# Altium footprint library CMR_Miscellaneous_Devices.PcbLib: 103 footprints (part 4 of 7)
Each footprint in its own frame and in the unit in brackets; x right, y up, seen from the top. Pads: shape width x height; smd on the part's side, far side on the other; paste and mask are expansions set on the pad; w line width, h text height; cw(c..) or ccw(c..) is an arc to the next point about the centre after c.
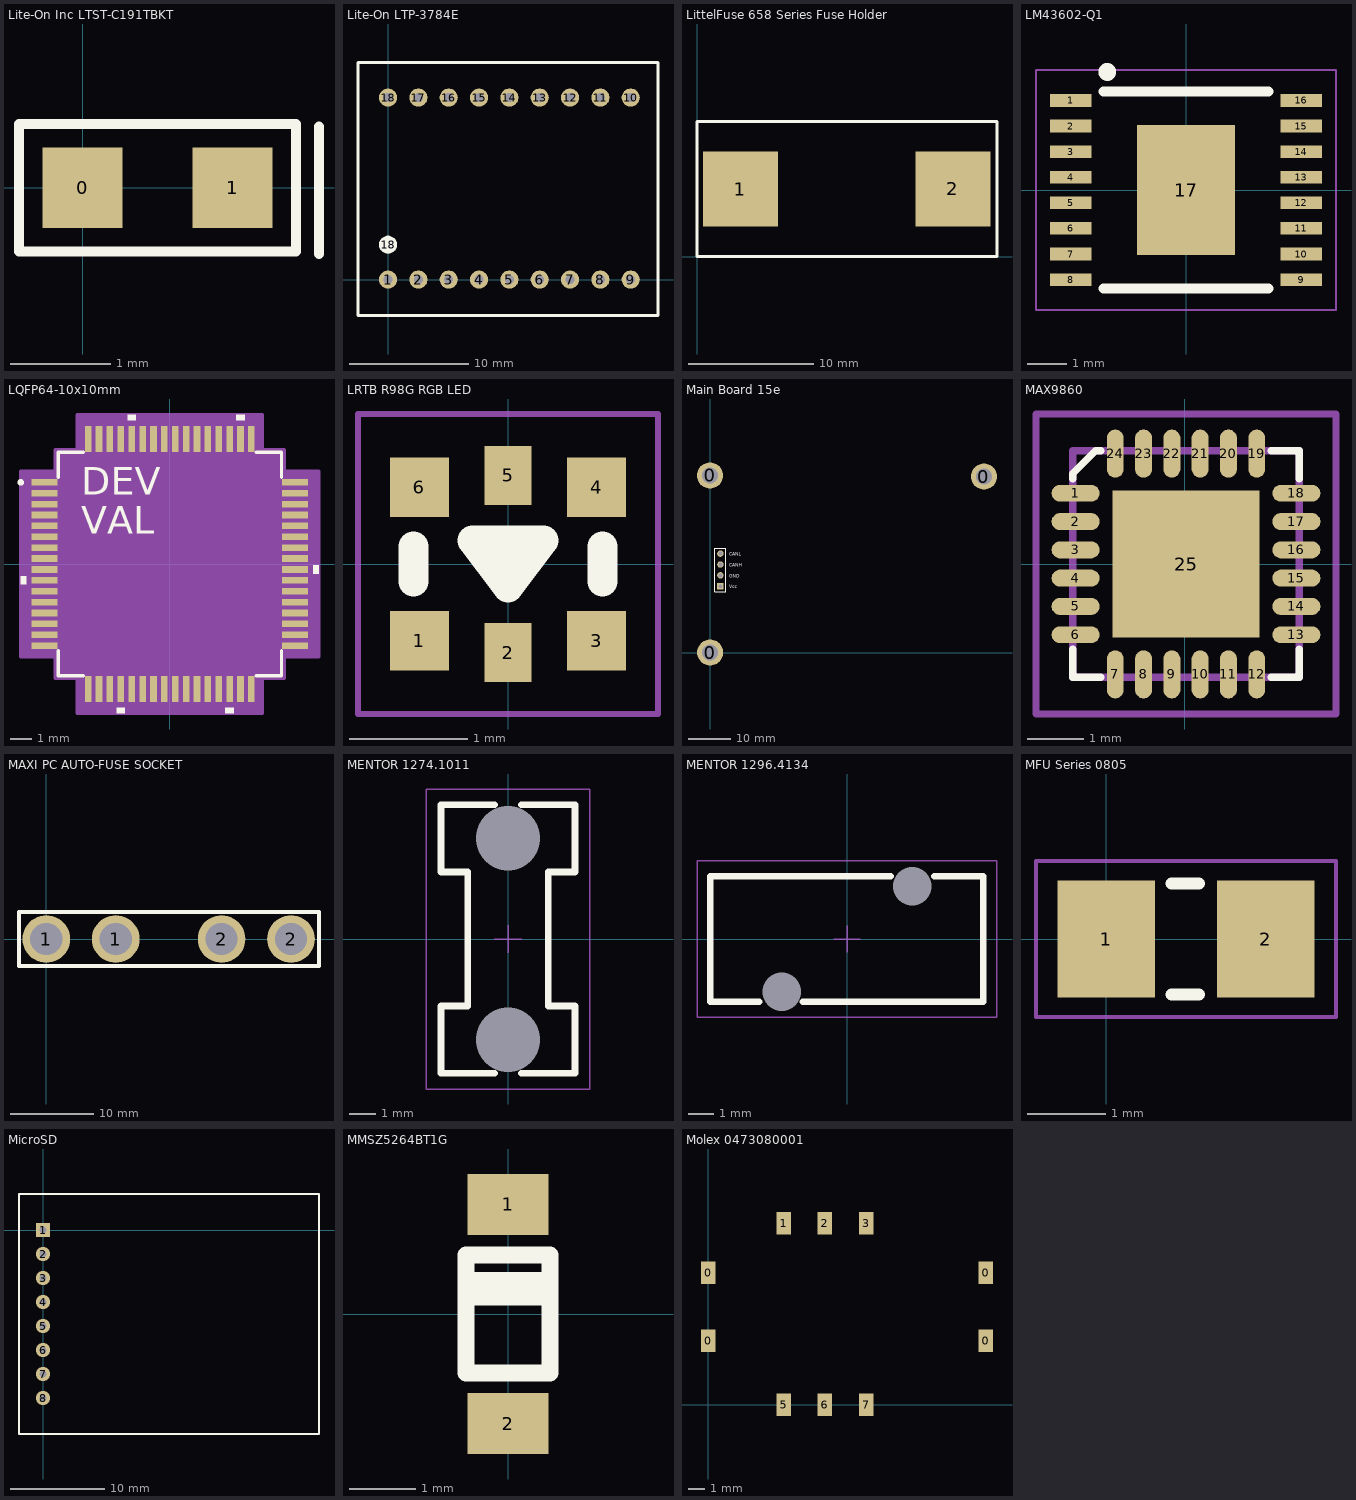
[diagram p3: the footprints below, top view; thin cyan lines are the x and y axes]

## Lite-On Inc LTST-C191TBKT [mm] "LED 468NM BLUE CLEAR 0603 SMD"
height 55
pads (2):
  rect 0.8x0.8 smd: 0(0,0) 1(1.5,0)
Top Overlay:
  lines w0.1: 2.362,-0.66 2.362,0.61 ; -0.635,-0.635 2.134,-0.635 2.134,0.635 -0.635,0.635 -0.635,-0.635
3D body: height 0.55, standoff 0, extent -0.508,-0.508 2.007,0.508

## Lite-On LTP-3784E [mil]
pads (19):
  round 60 hole 30: 1(0,0) 2(100,0) 3(200,0) 4(300,0) 5(400,0) 6(500,0) 7(600,0) 8(700,0) 9(800,0) 10(800,600) 11(700,600) 12(600,600) 13(500,600) 14(400,600) 15(300,600) 16(200,600) 17(100,600) 18(0,600)
  round 60 on Top Overlay: 18(0,115)
Top Overlay:
  lines w10: -98.98,-117.68 -98.98,715 890,715 890,-117.68 -98.98,-117.68
3D body: height 307.09, standoff 39.37, extent -98.96,-117.66 889.98,714.98

## LittelFuse 658 Series Fuse Holder [mm] "Fuse Holder"
height 13.2
pads (2):
  rect 6x6 smd: 1(3.48,5.385) 2(20.472,5.41)
Top Overlay:
  lines w0.254: 0,0 24,0 24,10.8 0,10.8 0,0
3D body: height 13.2, standoff 0, extent 0.584,-0.076 23.292,10.744

## LM43602-Q1 [mm] "SIMPLE SWITCHER 3.5V TO 36V INPUT 2A OUTPUT"
pads (17):
  rect 1.05x0.32 smd: 1(-2.925,2.275) 2(-2.925,1.625) 3(-2.925,0.975) 4(-2.925,0.325) 5(-2.925,-0.325) 6(-2.925,-0.975) 7(-2.925,-1.625) 8(-2.925,-2.275) 9(2.925,-2.275) 10(2.925,-1.625) 11(2.925,-0.975) 12(2.925,-0.325) 13(2.925,0.325) 14(2.925,0.975) 15(2.925,1.625) 16(2.925,2.275)
  rect 2.5x3.3 smd paste-0.5: 17(0,0)
Top Overlay:
  circle w0.254: c-2,3 r0.1
  lines w0.254: -2.1,-2.5 2.1,-2.5 ; -2.1,2.5 2.1,2.5
Mechanical 15:
  lines w0.051: -0.508,0 0.508,0 ; 0,-0.508 0,0.508 ; -3.81,-3.048 -3.81,2.032 -3.81,3.048 0,3.048 3.81,3.048 3.81,2.54 3.81,-3.048 0,-3.048 -3.81,-3.048
3D body "tssop_16.step": height 1.19, standoff -0.03, extent -3.211,-2.504 3.191,2.496

## LQFP64-10x10mm [mm]
pads (64):
  rect 1.194x0.305 smd: 1(-5.75,3.75) 2(-5.75,3.25) 3(-5.75,2.75) 4(-5.75,2.25) 5(-5.75,1.75) 6(-5.75,1.25) 7(-5.75,0.75) 8(-5.75,0.25) 9(-5.75,-0.25) 10(-5.75,-0.75) 11(-5.75,-1.25) 12(-5.75,-1.75) 13(-5.75,-2.25) 14(-5.75,-2.75) 15(-5.75,-3.25) 16(-5.75,-3.75) 33(5.75,-3.75) 34(5.75,-3.25) 35(5.75,-2.75) 36(5.75,-2.25) 37(5.75,-1.75) 38(5.75,-1.25) 39(5.75,-0.75) 40(5.75,-0.25) 41(5.75,0.25) 42(5.75,0.75) 43(5.75,1.25) 44(5.75,1.75) 45(5.75,2.25) 46(5.75,2.75) 47(5.75,3.25) 48(5.75,3.75)
  rect 0.305x1.194 smd: 17(-3.75,-5.75) 18(-3.25,-5.75) 19(-2.75,-5.75) 20(-2.25,-5.75) 21(-1.75,-5.75) 22(-1.25,-5.75) 23(-0.75,-5.75) 24(-0.25,-5.75) 25(0.25,-5.75) 26(0.75,-5.75) 27(1.25,-5.75) 28(1.75,-5.75) 29(2.25,-5.75) 30(2.75,-5.75) 31(3.25,-5.75) 32(3.75,-5.75) 49(3.75,5.75) 50(3.25,5.75) 51(2.75,5.75) 52(2.25,5.75) 53(1.75,5.75) 54(1.25,5.75) 55(0.75,5.75) 56(0.25,5.75) 57(-0.25,5.75) 58(-0.75,5.75) 59(-1.25,5.75) 60(-1.75,5.75) 61(-2.25,5.75) 62(-2.75,5.75) 63(-3.25,5.75) 64(-3.75,5.75)
Top Overlay:
  circle w0.152: c-6.851,3.75 r0.076
  region: -6.601,-0.56 -6.855,-0.56 -6.855,-0.941 -6.601,-0.941
  region: -2.06,-6.601 -2.441,-6.601 -2.441,-6.855 -2.06,-6.855
  region: 2.94,-6.601 2.559,-6.601 2.559,-6.855 2.94,-6.855
  region: 6.601,-0.059 6.855,-0.059 6.855,-0.44 6.601,-0.44
  region: 3.441,6.601 3.06,6.601 3.06,6.855 3.441,6.855
  region: -1.559,6.601 -1.94,6.601 -1.94,6.855 -1.559,6.855
  lines w0.152: -5.131,-3.975 -5.131,-5.131 -3.975,-5.131 ; -5.131,3.975 -5.131,5.131 -3.975,5.131 ; 3.975,-5.131 5.131,-5.131 5.131,-3.975 ; 3.975,5.131 5.131,5.131 5.131,3.975
  text "DEV" at -4.064,3.175 h1.27
  text "VAL" at -4.064,1.397 h1.27
Mechanical 13:
  circle w0: c-4.518,3.75 r0.076
  text "RefDes2" at 0,0 h1.27
Mechanical 15:
  region: -4.258,-5.258 -5.258,-5.258 -5.258,-4.258 -6.855,-4.258 -6.855,4.258 -5.258,4.258 -5.258,5.258 -4.258,5.258 -4.258,6.855 4.258,6.855 4.258,5.258 5.258,5.258 5.258,4.258 6.855,4.258 6.855,-4.258 5.258,-4.258 5.258,-5.258 4.258,-5.258 4.258,-6.855 -4.258,-6.855
  lines w0.152: -6.855,-4.258 -5.258,-4.258 -5.258,-5.258 -4.258,-5.258 -4.258,-6.855 4.258,-6.855 4.258,-5.258 5.258,-5.258 5.258,-4.258 6.855,-4.258 6.855,4.258 5.258,4.258 5.258,5.258 4.258,5.258 4.258,6.855 -4.258,6.855 -4.258,5.258 -5.258,5.258 -5.258,4.258 -6.855,4.258 -6.855,-4.258
Multi-Layer:
  text "Copyright (C) 2016 Accelerated Designs. All rights reserved" at -0.127,-1.778 h0.03
3D body "LQFP64-10x10mm.stp": height 1.6, standoff 0, extent -5.997,-5.997 5.997,5.997

## LRTB R98G RGB LED [mm] "OSRAM SMT RGB LED LRTB R98G"
pads (6):
  rect 0.5x0.5 smd: 1(-0.75,-0.65) 3(0.75,-0.65) 4(0.75,0.65) 6(-0.75,0.65)
  rect 0.4x0.5 smd: 2(0,-0.75) 5(0,0.75)
Top Overlay:
  lines w0.254: -0.8,-0.15 -0.8,0.15 ; 0,0 -0.3,0.2 ; 0.8,-0.15 0.8,0.15 ; -0.3,0.2 0,-0.2 0.3,0.2 -0.3,0.2
Mechanical 15:
  lines w0.051: -0.254,0 0.254,0 ; 0,-0.254 0,0.254 ; -1.27,-1.27 -1.27,0.508 -1.27,1.27 0,1.27 1.27,1.27 1.27,0.254 1.27,-1.27 0,-1.27 -1.27,-1.27
3D body: height 0.9, standoff 0, extent -0.8,-0.8 0.8,0.8
3D body: height 0.91, standoff 0.9, extent -0.65,-0.6 0.65,0.6

## Main Board 15e [mm] "15e Main Board connection for DAQ node"
height 2
pads (7):
  round 6.1 hole 3.7: 0(-0.025,41.377) 0(0,0) 0(63.983,41.123)
  rect 1.5x1.5 hole 0.9: 1(2.388,15.494)
  round 1.5 hole 0.9: 2(2.388,18.034) 3(2.388,20.574) 4(2.388,23.114)
Top Overlay:
  lines w0.254: 1.118,14.224 1.118,24.384 3.658,24.384 3.658,14.224 1.118,14.224
  text "Vcc" at 4.42,14.986 h0.76
  text "GND" at 4.42,17.526 h0.76
  text "CANH" at 4.42,20.066 h0.76
  text "CANL" at 4.42,22.606 h0.76
3D body "Pin Header 1x4 TH Pitch 2.54mm.stp": height 16.35, standoff 3.66, extent 40.869,8.611 43.409,18.771
3D body "Pin Header 1x4 TH Pitch 2.54mm.stp": height 16.35, standoff 3.66, extent 38.329,8.611 40.869,18.771
3D body "Pin Header 1x4 TH Pitch 2.54mm.stp": height 9.5, standoff -3.2, extent 1.118,14.224 3.658,24.384
3D body "CMR_Main Board_PCBDoc.step": height 11.94, standoff 4.08, extent -2.438,-2.311 66.396,43.663

## MAX9860 [mm]
pads (25):
  oval 0.85x0.3 smd: 1(-1.925,1.25) 2(-1.925,0.75) 3(-1.925,0.25) 4(-1.925,-0.25) 5(-1.925,-0.75) 6(-1.925,-1.25) 13(1.975,-1.25) 14(1.975,-0.75) 15(1.975,-0.25) 16(1.975,0.25) 17(1.975,0.75) 18(1.975,1.25)
  oval 0.3x0.85 smd: 7(-1.225,-1.95) 8(-0.725,-1.95) 9(-0.225,-1.95) 10(0.275,-1.95) 11(0.775,-1.95) 12(1.275,-1.95) 19(1.275,1.95) 20(0.775,1.95) 21(0.275,1.95) 22(-0.225,1.95) 23(-0.725,1.95) 24(-1.225,1.95)
  rect 2.6x2.6 smd: 25(0.025,0)
Top Overlay:
  lines w0.127: -1.975,-1.5 -1.975,-2 -1.475,-2 ; -1.975,1.5 -1.975,1.6 -1.575,2 -1.475,2 ; 1.525,-2 2.025,-2 2.025,-1.5 ; 1.525,2 2.025,2 2.025,1.5
Mechanical 1:
  lines w0.127: -2.625,-2.65 -2.625,2.65 2.675,2.65 2.675,-2.65 -2.625,-2.65 ; -1.975,-2 -1.975,2 2.025,2 2.025,-2 -1.975,-2

## MAXI PC AUTO-FUSE SOCKET [mil] "FUSE BLOCK BLADE 500V 40A PCB"
height 328
pads (4):
  round 225 hole 152: 1(0,0) 1(328,0) 2(828,0) 2(1156,0)
Top Overlay:
  lines w20: -129,-128 1288,-128 1288,128 -129,128 -129,-128
3D body: height 730.32, standoff 0, extent -115,-115 1275,115

## MENTOR 1274.1011 [mm] "MENTOR LIGHTPIPE FOR LED, 2 x 5MM"
pads (2):
  round 0 hole 2.4 unplated: 0(0,-3.75) 0(0,3.75)
Top Overlay:
  lines w0.254: -0.5,-5 -2.5,-5 -2.5,-2.5 -1.5,-2.5 -1.5,2.5 -2.5,2.5 -2.5,5 -0.5,5 ; 0.5,-5 2.5,-5 2.5,-2.5 1.5,-2.5 1.5,2.5 2.5,2.5 2.5,5 0.5,5
Mechanical 15:
  lines w0.051: -0.508,0 0.508,0 ; 0,-0.508 0,0.508 ; -3.048,-5.588 0,-5.588 3.048,-5.588 3.048,5.588 -3.048,5.588 -3.048,-1.27 -3.048,-5.588
3D body "1274_1011.stp": height 14.99, standoff -3.1, extent -2.5,-5 2.5,5
3D body: height 15.01, standoff 15, extent -1,-2.5 1,2.5

## MENTOR 1296.4134 [mm] "MENTOR QUAD LIGHTPIPE FOR LED, 2 x 3MM"
pads (2):
  round 0 hole 1.5 unplated: 0(-2.55,-2.05) 0(2.55,2.05)
Top Overlay:
  lines w0.254: -3.425,-2.45 -5.325,-2.45 -5.325,2.45 1.7,2.45 ; -1.725,-2.45 5.3,-2.45 5.3,2.45 3.4,2.45
Mechanical 15:
  lines w0.051: -0.508,0 0.508,0 ; 0,-0.508 0,0.508 ; -5.842,-3.048 -5.842,0 -5.842,3.048 -0.254,3.048 5.842,3.048 5.842,1.778 5.842,-3.048 4.064,-3.048 -5.842,-3.048
3D body: height 15.01, standoff 15, extent 2.794,-1.524 4.826,1.524
3D body: height 15.01, standoff 15, extent 0.254,-1.524 2.286,1.524
3D body: height 15.01, standoff 15, extent -2.286,-1.524 -0.254,1.524
3D body: height 15.01, standoff 15, extent -4.826,-1.524 -2.794,1.524
3D body "1296_4134.stp": height 15, standoff -3.1, extent -5.31,-2.45 5.31,2.45

## MFU Series 0805 [mm] "SMT Fuse, 0805, Vishay MFU Series"
height 0.45
pads (2):
  rect 1.25x1.5 smd: 1(0,0) 2(2.05,0)
Top Overlay:
  lines w0.152: 0.838,-0.711 1.194,-0.711 ; 0.838,0.711 1.194,0.711
Mechanical 15:
  lines w0.05: -0.9,-1 2.7,-1 2.95,-1 2.95,1 -0.9,1 -0.9,-1
3D body: height 0.55, standoff 0, extent 0,-0.625 2,0.625

## MicroSD [mil]
pads (8):
  rect 60x60 hole 30: 1(0,0)
  round 60 hole 30: 2(0,-100) 3(0,-200) 4(0,-300) 5(0,-400) 6(0,-500) 7(0,-600) 8(0,-700)
Top Overlay:
  lines w10: -100,-850 -100,150 1150,150 1150,-850 -100,-850

## MMSZ5264BT1G [mil] "60v Zener"
pads (2):
  rect 48x36 smd: 1(0,65) 2(0,-65)
Top Overlay:
  lines w10: -25,10 25,10 ; -25,20 25,20 ; -25,-35 25,-35 25,35 0,35 -25,35 -25,-35
3D body: height 50, standoff 1, extent -25,-50 25,50

## Molex 0473080001 [mm]
pads (10):
  rect 0.9x1.4 smd: 0(0,3.95) 0(0,8.15) 0(17.1,3.95) 0(17.1,8.15) 1(4.65,11.2) 2(7.19,11.2) 3(9.73,11.2) 5(4.65,0) 6(7.19,0) 7(9.73,0)
3D body "Molex0473080001.stp": height 2, standoff -0.05, extent 0,-0.7 17.1,14.9

## NHD-320240WX [mm] "LCD Display"
height 8.6
3D body: height 11.95, standoff 6.35, extent 0,0 94.7,71.7